# Altium footprint library SMD Passive.PcbLib: 136 footprints (part 5 of 9)
Each footprint in its own frame and in the unit in brackets; x right, y up, seen from the top. Pads: shape width x height; smd on the part's side, far side on the other; paste and mask are expansions set on the pad; w line width, h text height; cw(c..) or ccw(c..) is an arc to the next point about the centre after c.
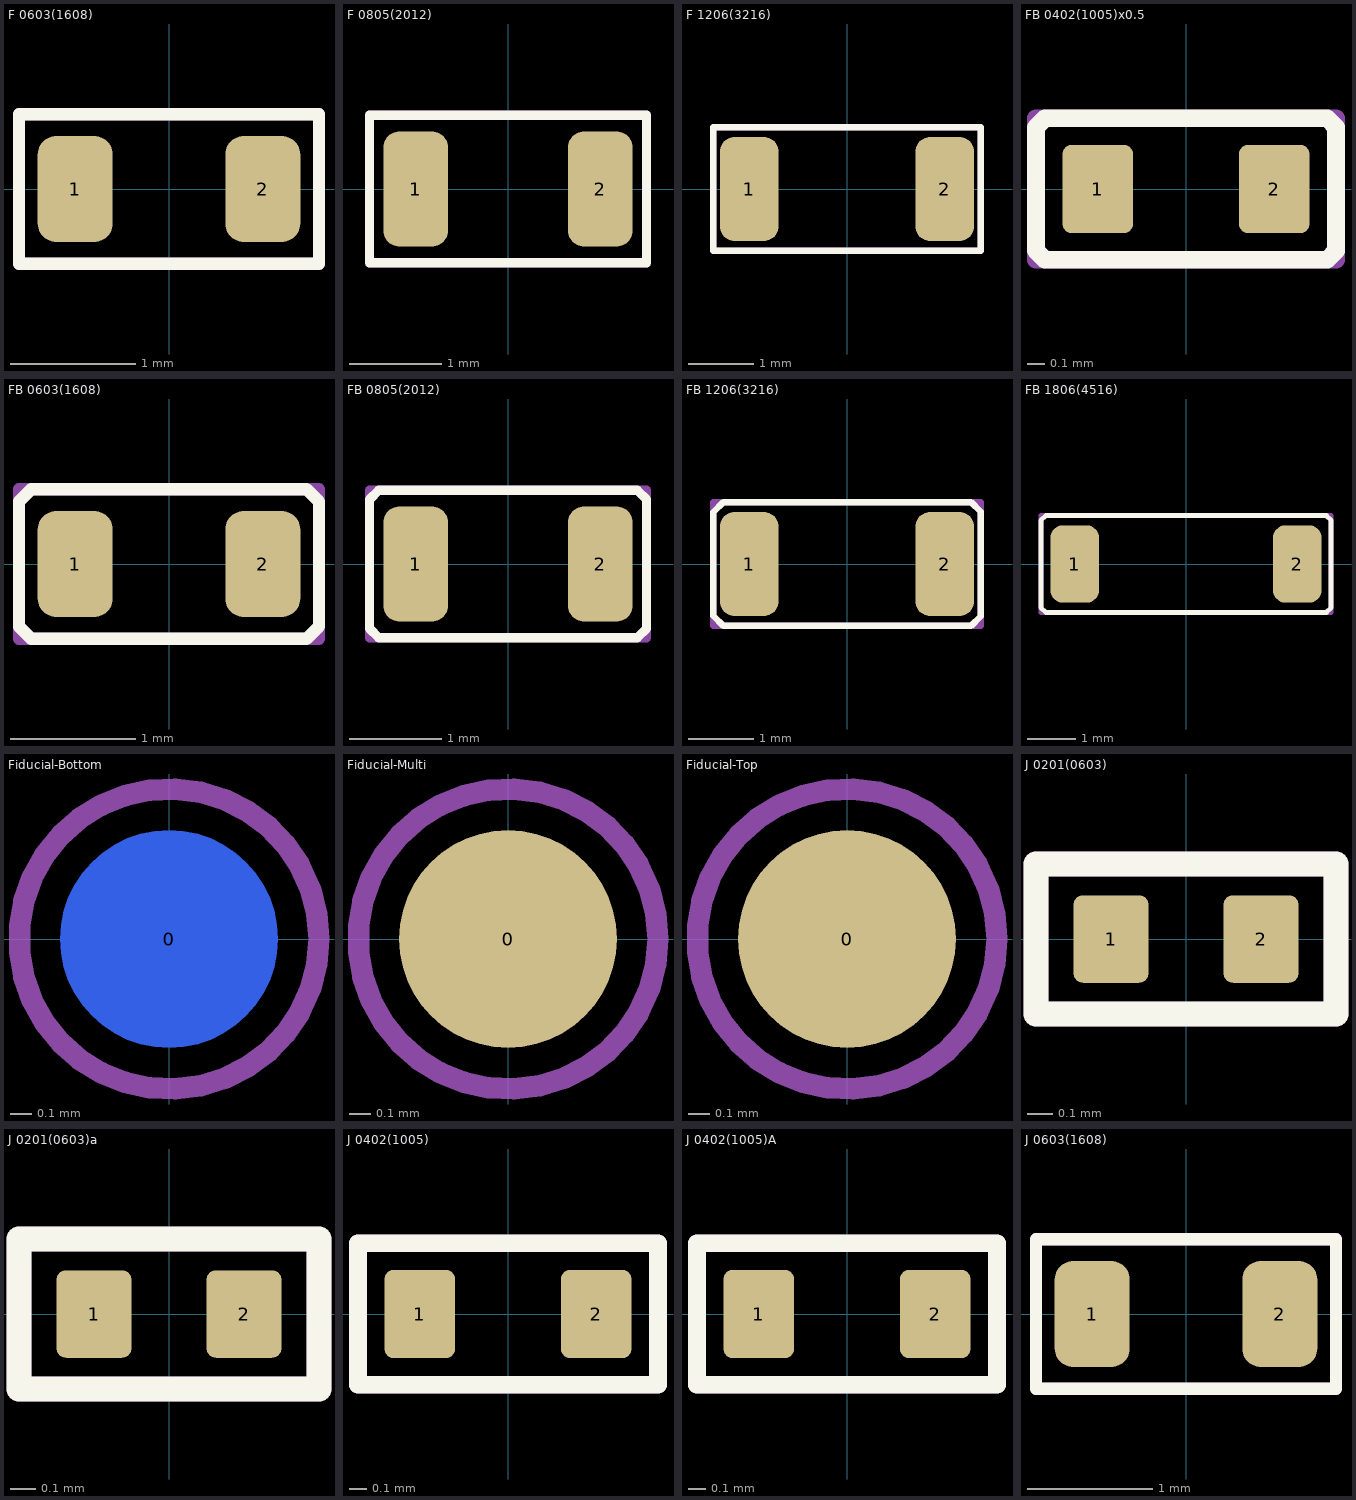
[diagram p4: the footprints below, top view; thin cyan lines are the x and y axes]

## F 0603(1608) [mm]
height 0.45
pads (2):
  rrect50% 0.6x0.85 smd: 1(-0.75,0) 2(0.75,0)
Top Overlay:
  lines w0.1: -1.2,-0.6 1.2,-0.6 1.2,0.6 -1.2,0.6 -1.2,-0.6
Top Courtyard:
  lines w0.1: -1.2,-0.6 -1.2,0.6 1.2,0.6 1.2,-0.6 -1.2,-0.6
3D body "SMD F-0603.STEP": height 0.45, standoff -0.01, extent -0.8,-0.4 0.8,0.4

## F 0805(2012) [mm]
height 0.55
pads (2):
  rrect50% 0.7x1.25 smd: 1(-1,0) 2(1,0)
Top Overlay:
  lines w0.1: -1.5,-0.8 -1.5,0.8 1.5,0.8 1.5,-0.8 -1.5,-0.8
Top Courtyard:
  lines w0.1: -1.5,-0.8 -1.5,0.8 1.5,0.8 1.5,-0.8 -1.5,-0.8
3D body "SMD F-0805.STEP": height 0.9, standoff 0.3, extent -1,-0.625 1,0.625

## F 1206(3216) [mm]
height 0.55
pads (2):
  rrect50% 0.9x1.6 smd mask+0.102: 1(-1.5,0) 2(1.5,0)
Top Overlay:
  lines w0.1: -2.05,-0.95 -2.05,0.95 2.05,0.95 2.05,-0.95 -2.05,-0.95
Top Courtyard:
  lines w0.1: -2.05,-0.95 -2.05,0.95 2.05,0.95 2.05,-0.95 -2.05,-0.95
3D body "SMD F-1206.STEP": height 0.9, standoff 0.3, extent -1.6,-0.8 1.6,0.8

## FB 0402(1005)x0.5 [mm]
height 0.35
pads (2):
  rrect25% 0.4x0.5 smd mask+0.102: 1(-0.5,0) 2(0.5,0)
Top Overlay:
  lines w0.1: -0.85,-0.349 -0.85,0.349 -0.799,0.4 0.8,0.4 0.85,0.35 0.85,-0.35 0.8,-0.4 -0.799,-0.4 -0.85,-0.349
Top Courtyard:
  lines w0.1: -0.85,-0.4 -0.85,0.4 0.85,0.4 0.85,-0.4 -0.85,-0.4
3D body "FB 0402.STEP": height 0.5, standoff 0, extent -0.5,-0.25 0.5,0.25

## FB 0603(1608) [mm]
height 0.8
pads (2):
  rrect50% 0.6x0.85 smd: 1(-0.75,0) 2(0.75,0)
Top Overlay:
  lines w0.1: -1.2,-0.501 -1.2,0.501 -1.101,0.6 1.1,0.6 1.2,0.5 1.2,-0.5 1.1,-0.6 -1.101,-0.6 -1.2,-0.501
Top Courtyard:
  lines w0.1: -1.2,-0.6 -1.2,0.6 1.2,0.6 1.2,-0.6 -1.2,-0.6
3D body "FB 0603.STEP": height 0.8, standoff 0, extent -0.8,-0.4 0.8,0.4

## FB 0805(2012) [mm]
height 0.65
pads (2):
  rrect50% 0.7x1.25 smd: 1(-1,0) 2(1,0)
Top Overlay:
  lines w0.1: -1.5,-0.699 -1.5,0.699 -1.399,0.8 1.4,0.8 1.5,0.7 1.5,-0.7 1.4,-0.8 -1.399,-0.8 -1.5,-0.699
Top Courtyard:
  lines w0.1: -1.5,-0.8 1.5,-0.8 1.5,0.8 -1.5,0.8 -1.5,-0.8
3D body "FB 0805.STEP": height 0.85, standoff 0, extent -1,-0.625 1,0.625

## FB 1206(3216) [mm]
height 0.85
pads (2):
  rrect50% 0.9x1.6 smd mask+0.102: 1(-1.5,0) 2(1.5,0)
Top Overlay:
  lines w0.1: -2.05,-0.792 -1.892,-0.95 1.9,-0.95 2.05,-0.8 2.05,0.8 1.9,0.95 -1.892,0.95 -2.05,0.792 -2.05,-0.792
Top Courtyard:
  lines w0.1: -2.05,-0.95 -2.05,0.95 2.05,0.95 2.05,-0.95 -2.05,-0.95
3D body "FB 1206.STEP": height 1.11, standoff 0, extent -1.6,-0.8 1.6,0.8

## FB 1806(4516) [mm]
height 1.6
pads (2):
  rrect50% 1x1.6 smd: 1(-2.3,0) 2(2.3,0)
Top Overlay:
  lines w0.1: -3,-0.9 -3,0.9 -2.9,1 2.901,1 3,0.901 3,-0.901 2.901,-1 -2.9,-1 -3,-0.9
Top Courtyard:
  lines w0.1: -3,-1 3,-1 3,1 -3,1 -3,-1
3D body "FB 1806.STEP": height 1.61, standoff 0, extent -2.25,-0.8 2.25,0.8

## Fiducial-Bottom [mil]
pads (1):
  round 40 smd far side paste+0 mask+19.68: 0(0,0)
Top Courtyard:
  circle w3.94: c0,0 r27.56

## Fiducial-Multi [mil]
pads (1):
  round 40 all layers, no hole paste-99999 mask+19.68: 0(0,0)
Top Courtyard:
  circle w3.94: c0,0 r27.56

## Fiducial-Top [mil]
pads (1):
  round 40 smd paste+0 mask+19.68: 0(0,0)
Top Courtyard:
  circle w3.94: c0,0 r27.56

## J 0201(0603) [mm]
height 0.35
pads (2):
  rrect25% 0.3x0.35 smd paste-0.1 mask+0.102: 1(-0.3,0) 2(0.3,0)
Top Overlay:
  lines w0.1: -0.6,-0.3 0.6,-0.3 0.6,0.3 -0.6,0.3 -0.6,-0.3
Top Paste:
  region: -0.285,0.135 -0.315,0.135 -0.339,0.135 -0.383,0.117 -0.417,0.083 -0.435,0.039 -0.435,0.015 -0.435,-0.015 -0.435,-0.039 -0.417,-0.083 -0.383,-0.117 -0.339,-0.135 -0.315,-0.135 -0.285,-0.135 -0.261,-0.135 -0.217,-0.117 -0.183,-0.083 -0.165,-0.039 -0.165,-0.015 -0.165,0.015 -0.165,0.039 -0.183,0.083 -0.217,0.117 -0.261,0.135
  region: 0.285,0.135 0.315,0.135 0.339,0.135 0.383,0.117 0.417,0.083 0.435,0.039 0.435,0.015 0.435,-0.015 0.435,-0.039 0.417,-0.083 0.383,-0.117 0.339,-0.135 0.315,-0.135 0.285,-0.135 0.261,-0.135 0.217,-0.117 0.183,-0.083 0.165,-0.039 0.165,-0.015 0.165,0.015 0.165,0.039 0.183,0.083 0.217,0.117 0.261,0.135
Top Solder:
  region: -0.425,0.25 0.425,0.25 0.45,0.25 0.496,0.231 0.531,0.196 0.55,0.15 0.55,0.125 0.55,-0.125 0.55,-0.15 0.531,-0.196 0.496,-0.231 0.45,-0.25 0.425,-0.25 -0.425,-0.25 -0.45,-0.25 -0.496,-0.231 -0.531,-0.196 -0.55,-0.15 -0.55,-0.125 -0.55,0.125 -0.55,0.15 -0.531,0.196 -0.496,0.231 -0.45,0.25
Top Courtyard:
  lines w0.1: -0.6,-0.3 0.6,-0.3 0.6,0.3 -0.6,0.3 -0.6,-0.3
3D body "SMD R-0201-0.STEP": height 0.34, standoff 0, extent -0.34,-0.165 0.34,0.165

## J 0201(0603)a [mm]
height 0.35
pads (2):
  rrect25% 0.3x0.35 smd paste-0.1 mask+0.102: 1(-0.3,0) 2(0.3,0)
Top Overlay:
  lines w0.1: -0.6,-0.3 -0.6,0.3 0.6,0.3 0.6,-0.3 -0.6,-0.3
Top Paste:
  region: 0.285,0.135 0.315,0.135 0.339,0.135 0.383,0.117 0.417,0.083 0.435,0.039 0.435,0.015 0.435,-0.015 0.435,-0.039 0.417,-0.083 0.383,-0.117 0.339,-0.135 0.315,-0.135 0.285,-0.135 0.261,-0.135 0.217,-0.117 0.183,-0.083 0.165,-0.039 0.165,-0.015 0.165,0.015 0.165,0.039 0.183,0.083 0.217,0.117 0.261,0.135
  region: -0.285,0.135 -0.315,0.135 -0.339,0.135 -0.383,0.117 -0.417,0.083 -0.435,0.039 -0.435,0.015 -0.435,-0.015 -0.435,-0.039 -0.417,-0.083 -0.383,-0.117 -0.339,-0.135 -0.315,-0.135 -0.285,-0.135 -0.261,-0.135 -0.217,-0.117 -0.183,-0.083 -0.165,-0.039 -0.165,-0.015 -0.165,0.015 -0.165,0.039 -0.183,0.083 -0.217,0.117 -0.261,0.135
Top Solder:
  region: -0.425,0.25 0.425,0.25 0.45,0.25 0.496,0.231 0.531,0.196 0.55,0.15 0.55,0.125 0.55,-0.125 0.55,-0.15 0.531,-0.196 0.496,-0.231 0.45,-0.25 0.425,-0.25 -0.425,-0.25 -0.45,-0.25 -0.496,-0.231 -0.531,-0.196 -0.55,-0.15 -0.55,-0.125 -0.55,0.125 -0.55,0.15 -0.531,0.196 -0.496,0.231 -0.45,0.25
Top Courtyard:
  lines w0.1: -0.6,-0.3 0.6,-0.3 0.6,0.3 -0.6,0.3 -0.6,-0.3
3D body "SMD R-0201-0.STEP": height 0.34, standoff 0, extent -0.34,-0.165 0.34,0.165

## J 0402(1005) [mm]
height 0.35
pads (2):
  rrect25% 0.4x0.5 smd mask+0.102: 1(-0.5,0) 2(0.5,0)
Top Overlay:
  lines w0.1: -0.85,-0.4 0.85,-0.4 0.85,0.4 -0.85,0.4 -0.85,-0.4
Top Courtyard:
  lines w0.1: -0.85,-0.4 -0.85,0.4 0.85,0.4 0.85,-0.4 -0.85,-0.4
3D body "SMD R-0402-0.STEP": height 0.35, standoff 0, extent -0.5,-0.25 0.5,0.25

## J 0402(1005)A [mm]
height 0.35
pads (2):
  rrect25% 0.4x0.5 smd mask+0.102: 1(-0.5,0) 2(0.5,0)
Top Overlay:
  lines w0.1: -0.85,-0.4 -0.85,0.4 0.85,0.4 0.85,-0.4 -0.85,-0.4
Top Courtyard:
  lines w0.1: -0.85,-0.4 -0.85,0.4 0.85,0.4 0.85,-0.4 -0.85,-0.4
3D body "SMD R-0402-0.STEP": height 0.35, standoff 0, extent -0.5,-0.25 0.5,0.25

## J 0603(1608) [mm]
height 0.45
pads (2):
  rrect50% 0.6x0.85 smd: 1(-0.75,0) 2(0.75,0)
Top Overlay:
  lines w0.1: -1.2,-0.6 -1.2,0.6 1.2,0.6 1.2,-0.6 -1.2,-0.6
Top Courtyard:
  lines w0.1: -1.2,-0.6 1.2,-0.6 1.2,0.6 -1.2,0.6 -1.2,-0.6
3D body "SMD R-0603-0.STEP": height 0.45, standoff 0, extent -0.8,-0.4 0.8,0.4